# Altium footprint library custom.PcbLib: 330 footprints (part 16 of 21)
Each footprint in its own frame and in the unit in brackets; x right, y up, seen from the top. Pads: shape width x height; smd on the part's side, far side on the other; paste and mask are expansions set on the pad; w line width, h text height; cw(c..) or ccw(c..) is an arc to the next point about the centre after c.
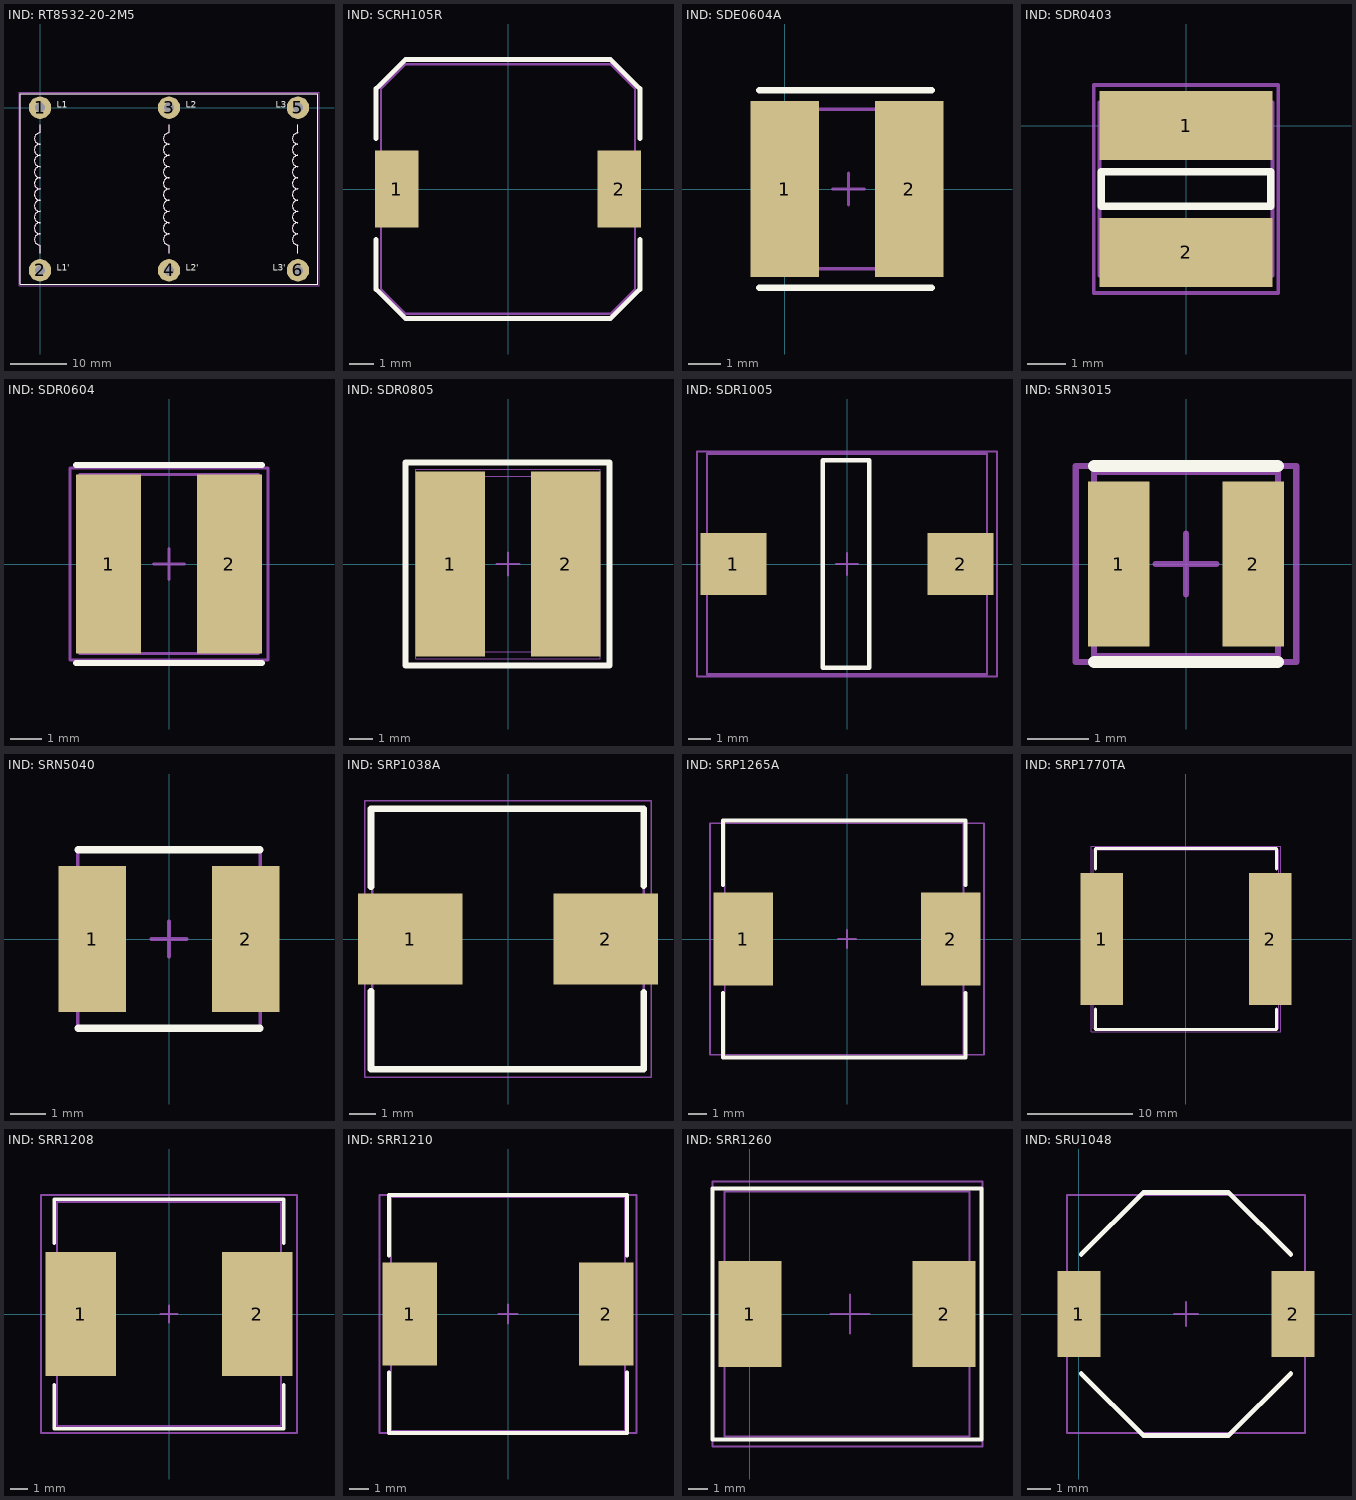
[diagram p15: the footprints below, top view; thin cyan lines are the x and y axes]

## IND: RT8532-20-2M5 [mm]
pads (6):
  round 4 hole 1.8: 1(0,0) 2(0,-29) 3(23,0) 4(23,-29) 5(46,0) 6(46,-29)
Top Overlay:
  lines w0.2: 0,-26 0,-24.5 cw(c0,-23.5) 0,-22.5 cw(c0,-21.5) 0,-20.5 cw(c0,-19.5) 0,-18.5 cw(c0,-17.5) 0,-16.5 cw(c0,-15.5) 0,-14.5 cw(c0,-13.5) 0,-12.5 cw(c0,-11.5) 0,-10.5 cw(c0,-9.5) 0,-8.5 cw(c0,-7.5) 0,-6.5 cw(c0,-5.5) 0,-4.5 0,-3 ; 23,-26 23,-24.5 cw(c23,-23.5) 23,-22.5 cw(c23,-21.5) 23,-20.5 cw(c23,-19.5) 23,-18.5 cw(c23,-17.5) 23,-16.5 cw(c23,-15.5) 23,-14.5 cw(c23,-13.5) 23,-12.5 cw(c23,-11.5) 23,-10.5 cw(c23,-9.5) 23,-8.5 cw(c23,-7.5) 23,-6.5 cw(c23,-5.5) 23,-4.5 23,-3 ; 46,-26 46,-24.5 cw(c46,-23.5) 46,-22.5 cw(c46,-21.5) 46,-20.5 cw(c46,-19.5) 46,-18.5 cw(c46,-17.5) 46,-16.5 cw(c46,-15.5) 46,-14.5 cw(c46,-13.5) 46,-12.5 cw(c46,-11.5) 46,-10.5 cw(c46,-9.5) 46,-8.5 cw(c46,-7.5) 46,-6.5 cw(c46,-5.5) 46,-4.5 46,-3 ; -3.5,-31.5 49.5,-31.5 49.5,2.5 -3.5,2.5 -3.5,-31.5
  text "L2" at 26,-0.5 h2
  text "L2'" at 26,-29.5 h2
  text "L3" at 42,-0.5 h2
  text "L1" at 3,-0.5 h2
  text "L3'" at 41.5,-29.5 h2
  text "L1'" at 3,-29.5 h2
Top Assy:
  lines w0.1: 0,-26 0,-24.5 cw(c0,-23.5) 0,-22.5 cw(c0,-21.5) 0,-20.5 cw(c0,-19.5) 0,-18.5 cw(c0,-17.5) 0,-16.5 cw(c0,-15.5) 0,-14.5 cw(c0,-13.5) 0,-12.5 cw(c0,-11.5) 0,-10.5 cw(c0,-9.5) 0,-8.5 cw(c0,-7.5) 0,-6.5 cw(c0,-5.5) 0,-4.5 0,-3 ; 23,-26 23,-24.5 cw(c23,-23.5) 23,-22.5 cw(c23,-21.5) 23,-20.5 cw(c23,-19.5) 23,-18.5 cw(c23,-17.5) 23,-16.5 cw(c23,-15.5) 23,-14.5 cw(c23,-13.5) 23,-12.5 cw(c23,-11.5) 23,-10.5 cw(c23,-9.5) 23,-8.5 cw(c23,-7.5) 23,-6.5 cw(c23,-5.5) 23,-4.5 23,-3 ; 46,-26 46,-24.5 cw(c46,-23.5) 46,-22.5 cw(c46,-21.5) 46,-20.5 cw(c46,-19.5) 46,-18.5 cw(c46,-17.5) 46,-16.5 cw(c46,-15.5) 46,-14.5 cw(c46,-13.5) 46,-12.5 cw(c46,-11.5) 46,-10.5 cw(c46,-9.5) 46,-8.5 cw(c46,-7.5) 46,-6.5 cw(c46,-5.5) 46,-4.5 46,-3 ; -3.5,-31.5 -3.5,2 -3.5,2.5 49.5,2.5 49.5,-31.5 -3.5,-31.5
  text "L1" at 3,-0.5 h2
  text "L1'" at 3,-29.5 h2
  text "L2" at 26,-0.5 h2
  text "L2'" at 26,-29.5 h2
  text "L3" at 42,-0.5 h2
  text "L3'" at 41.5,-29.5 h2
Size Area:
  lines w0.1: -3.75,-31.75 49.75,-31.75 49.75,2.75 -3.75,2.75 -3.75,-31.75
3D body "RT8532-20-2M5.STEP": height 54.93, standoff -4, extent -3.5,-31.5 49.5,2.5

## IND: SCRH105R [mm] "Inductor"
height 5.1
pads (2):
  rect 1.8x3.2 smd: 1(-4.6,0) 2(4.6,0)
Top Overlay:
  lines w0.2: -5.45,-2.075 -5.45,-4.15 -4.25,-5.35 4.25,-5.35 5.45,-4.15 5.45,-2.075 ; -5.45,2.075 -5.45,4.15 -4.25,5.35 4.25,5.35 5.45,4.15 5.45,2.075
Top Assy:
  lines w0.1: -5.25,-4.15 -4.25,-5.15 4.25,-5.15 5.25,-4.15 5.25,4.15 4.25,5.15 -4.25,5.15 -5.25,4.15 -5.25,-4.15
3D body: height 5.1, standoff 0, extent -5.25,-5.15 5.25,5.15

## IND: SDE0604A [mm]
pads (2):
  rect 2.15x5.5 smd: 1(0,0) 2(3.9,0)
Top Overlay:
  lines w0.2: -0.8,-3.1 4.6,-3.1 ; -0.8,3.1 4.6,3.1
Top Assy:
  lines w0.1: -0.5,-2.5 -0.5,2.5 4.5,2.5 4.5,-2.5 -0.5,-2.5
Size Area:
  lines w0.1: 1.5,0 2.5,0 ; 2,-0.5 2,0.5
3D body "User Library-sdr0503_stp.STEP": height 3, standoff 0, extent -0.5,-2.5 4.5,2.5

## IND: SDR0403 [mm]
pads (2):
  rect 4.5x1.8 smd: 1(0,0) 2(0,-3.3)
Top Overlay:
  lines w0.2: -2.2,-2.1 2.2,-2.1 2.2,-1.2 -2.2,-1.2 -2.2,-2.1
Top Assy:
  lines w0.1: -2.25,-3.9 -2.25,0.25 -2.25,0.6 2.25,0.6 2.25,-3.9 -2.25,-3.9
Size Area:
  lines w0.1: -2.4,-4.35 2.4,-4.35 2.4,1.05 -2.4,1.05 -2.4,-4.35
3D body "User Library-SDR0403.STEP": height 3.5, standoff 0, extent -2.25,-3.9 2.25,0.6

## IND: SDR0604 [mm]
pads (2):
  rect 2.1x5.8 smd: 1(-1.95,0) 2(1.95,0)
Top Overlay:
  lines w0.2: -3,-3.2 3,-3.2 ; -3,3.2 3,3.2
Top Assy:
  lines w0.1: -2.9,-2.9 -2.9,2.9 2.9,2.9 2.9,-2.9 -2.9,-2.9
Size Area:
  lines w0.1: -0.5,0 0.5,0 ; 0,-0.5 0,0.5 ; -3.2,-3.1 -3.2,3.1 3.2,3.1 3.2,-3.1 -3.2,-3.1
3D body "SDR0604.STEP": height 4.8, standoff 0, extent -2.9,-2.9 2.9,2.9

## IND: SDR0805 [mm]
height 5.3
pads (2):
  rect 3x8 smd: 1(-2.5,0) 2(2.5,0)
Top Overlay:
  lines w0.254: -4.445,-4.4 4.4,-4.4 4.4,4.4 -4.445,4.4 -4.445,-4.4
Top Assy:
  lines w0.05: -3.7,-3.8 3.7,-3.8 3.7,3.8 -3.7,3.8 -3.7,-3.8
Size Area:
  lines w0.05: -4,-4.1 -4,4.1 4,4.1 4,-4.1 -4,-4.1
  lines w0.1: -0.5,0 0.5,0 ; 0,-0.5 0,0.5
3D body "SDR0805.STEP": height 5.08, standoff 0.03, extent -3.677,-3.75 3.677,3.75

## IND: SDR1005 [mm]
pads (2):
  rect 3x2.8 smd: 1(-5.15,0) 2(5.15,0)
Top Overlay:
  lines w0.2: -1.1,-4.7 1,-4.7 1,4.7 -1.1,4.7 -1.1,-4.7
Top Assy:
  lines w0.1: -6.35,-5 -6.35,5 6.35,5 6.35,-5 -6.35,-5
Size Area:
  lines w0.1: -0.5,0 0.5,0 ; 0,-0.5 0,0.5 ; -6.8,-5.1 6.8,-5.1 6.8,5.1 -6.8,5.1 -6.8,-5.1
3D body "Деталь2.STEP": height 5.1, standoff 0.1, extent -6.35,-5 6.35,5

## IND: SRN3015 [mm]
pads (2):
  rect 1x2.7 smd: 1(-1.1,0) 2(1.1,0)
Top Overlay:
  lines w0.2: -1.5,-1.6 1.5,-1.6 ; -1.5,1.6 1.5,1.6
Top Assy:
  lines w0.1: -1.5,-1.5 -1.5,-1.5 ; -1.5,-1.5 -1.5,1.5 1.5,1.5 1.5,-1.5 -1.5,-1.5
Size Area:
  lines w0.1: -0.5,0 0.5,0 ; 0,-0.5 0,0.5 ; -1.8,-1.6 -1.8,1.6 1.8,1.6 1.8,-1.6 -1.8,-1.6
3D body "srn3015.stp": height 1.5, standoff 0, extent -1.5,-1.5 1.5,1.5

## IND: SRN5040 [mm] "Precision Wire Wound Inductor, 2-Leads, Body 5,00x5,00mm, SRN5040 Series"
height 4
pads (2):
  rect 1.9x4.1 smd: 1(-2.15,0) 2(2.15,0)
Top Overlay:
  lines w0.2: -2.55,-2.5 2.55,-2.5 ; -2.55,2.5 2.55,2.5
Top Assy:
  lines w0.1: -2.55,-2.5 -2.55,2.5 2.55,2.5 2.55,-2.5 -2.55,-2.5
Size Area:
  lines w0.1: -0.5,0 0.5,0 ; 0,-0.5 0,0.5
3D body "User Library-SRN5040.step": height 4, standoff 0, extent -2.5,-2.5 2.5,2.5

## IND: SRP1038A [mm] "SMT inductor, 11x10x3.8 mm Bourns"
height 3.8
pads (2):
  rect 4x3.5 smd: 1(-3.75,0) 2(3.75,0)
Top Overlay:
  lines w0.254: -5.25,-2 -5.25,-5 5.2,-5 5.2,-2.05 ; -5.25,2 -5.25,5 5.2,5 5.2,2.05
Top Assy:
  lines w0.1: -5.2,-5 5.2,-5 5.2,5 -5.2,5 -5.2,-5
Size Area:
  lines w0.05: -5.5,-5.3 5.5,-5.3 5.5,5.3 -5.5,5.3 -5.5,-5.3
3D body "SRP 1038A.STEP": height 3.8, standoff 0.05, extent -5.2,-5 5.2,5

## IND: SRP1265A [mm]
pads (2):
  rect 3.2x5 smd: 1(-5.6,0) 2(5.6,0)
Top Overlay:
  lines w0.2: -6.7,-2.9 -6.7,-6.4 6.4,-6.4 6.4,-2.9 ; -6.7,2.9 -6.7,6.4 6.4,6.4 6.4,2.9
Top Assy:
  lines w0.1: -6.6,-6.25 -6.6,6.25 6.3,6.25 6.3,-6.25 -6.6,-6.25
Size Area:
  lines w0.1: -0.5,0 0.5,0 ; 0,-0.5 0,0.5 ; -7.4,-6.25 -7.4,6.25 7.4,6.25 7.4,-6.25 -7.4,-6.25
3D body "SRP1265A series.stp": height 6.31, standoff 0, extent -6.6,-6.25 6.3,6.25

## IND: SRP1770TA [mm] "SMD inductor, 17x17x7 mm"
height 7
pads (2):
  rect 4x12.5 smd: 1(-8,0) 2(8,0)
Top Overlay:
  lines w0.254: -8.6,-6.65 -8.6,-8.6 8.6,-8.6 8.6,-6.65 ; -8.6,6.65 -8.6,8.6 8.6,8.6 8.6,6.65
Top Assy:
  lines w0.1: -8.8,-8.5 8.8,-8.5 8.8,8.5 -8.8,8.5 -8.8,-8.5
Size Area:
  lines w0.05: -9,-8.8 9,-8.8 9,8.8 -9,8.8 -9,-8.8
3D body "SRP1770TA.stp": height 6.81, standoff 0, extent -8.85,-8.5 9.05,8.4

## IND: SRR1208 [mm]
pads (2):
  rect 4x7 smd: 1(-5,0) 2(5,0)
Top Overlay:
  lines w0.2: -6.5,-4 -6.5,-6.5 6.5,-6.5 6.5,-4 ; -6.5,4 -6.5,6.5 6.5,6.5 6.5,4
Top Assy:
  lines w0.1: -6.35,-6.35 -6.35,6.35 6.35,6.35 6.35,-6.35 -6.35,-6.35
Size Area:
  lines w0.1: -0.5,0 0.5,0 ; 0,-0.5 0,0.5 ; -7.25,-6.75 7.25,-6.75 7.25,6.75 -7.25,6.75 -7.25,-6.75
3D body "User Library-SRR1208.STEP": height 8.5, standoff 0.01, extent -6.35,-6.35 6.35,6.35

## IND: SRR1210 [mm]
pads (2):
  rect 2.8x5.3 smd: 1(-5.05,0) 2(5.05,0)
Top Overlay:
  lines w0.2: -6.1,-3 -6.1,-6.1 6.1,-6.1 6.1,-3 ; -6.1,3 -6.1,6.1 6.1,6.1 6.1,3
Top Assy:
  lines w0.1: -6,-6 -6,6 6,6 6,-6 -6,-6
Size Area:
  lines w0.1: -0.5,0 0.5,0 ; 0,-0.5 0,0.5 ; -6.6,-6.1 6.6,-6.1 6.6,6.1 -6.6,6.1 -6.6,-6.1
3D body "User Library-SRR1210_inductor.STEP": height 10.37, standoff 0.01, extent -6,-6 6,6

## IND: SRR1260 [mm]
pads (2):
  rect 3.2x5.4 smd: 1(0,0) 2(9.9,0)
Top Overlay:
  lines w0.2: -1.9,-6.4 11.8,-6.4 11.8,6.4 -1.9,6.4 -1.9,-6.4
Top Assy:
  lines w0.1: -1.3,-6.25 -1.3,6.25 11.2,6.25 11.2,-6.25 -1.3,-6.25
Size Area:
  lines w0.1: 4.1,0 6.1,0 ; 5.1,-1 5.1,1 ; -1.9,-6.75 -1.9,6.75 11.85,6.75 11.85,-6.75 -1.9,-6.75
3D body "SW3dPS-DRQ127_12.5x12.5.STEP": height 8, standoff 0, extent -1.3,-6.25 11.2,6.25

## IND: SRU1048 [mm]
pads (2):
  rect 1.8x3.6 smd: 1(0,0) 2(9,0)
Top Overlay:
  lines w0.2: 0.1,-2.5 2.7,-5.1 6.3,-5.1 8.9,-2.5 ; 0.1,2.5 2.7,5.1 6.3,5.1 8.9,2.5
Top Assy:
  lines w0.1: -0.5,-5 -0.5,5 9.5,5 9.5,-5 -0.5,-5
Size Area:
  lines w0.1: 4,0 5,0 ; 4.5,-0.5 4.5,0.5 ; -0.5,-5 -0.5,5 9.5,5 9.5,-5 -0.5,-5
3D body "sru1048.stp": height 4.82, standoff 0, extent -0.5,-5 9.5,5